# Altium footprint library ref-packages.PCBLIB: 1544 footprints (part 31 of 103) (continued)
## LCC-156 [mil] (continued)
Top Overlay:
  text "1" at -25,868.11 h77.5
Mechanical 16:
  drawing of 317 lines, arcs and shapes, not listed
Mechanical 27:
  lines w7.87: -1078.86,-1078.86 1078.86,-1078.86 1078.86,1078.86 -1078.86,1078.86 -1078.86,-1078.86

## LQFP48 [mm]
pads (48):
  rect 0.2x1 smd: 1(-2.75,-4.25) 2(-2.25,-4.25) 3(-1.75,-4.25) 4(-1.25,-4.25) 5(-0.75,-4.25) 6(-0.25,-4.25) 7(0.25,-4.25) 8(0.75,-4.25) 9(1.25,-4.25) 10(1.75,-4.25) 11(2.25,-4.25) 12(2.75,-4.25) 25(2.75,4.25) 26(2.25,4.25) 27(1.75,4.25) 28(1.25,4.25) 29(0.75,4.25) 30(0.25,4.25) 31(-0.25,4.25) 32(-0.75,4.25) 33(-1.25,4.25) 34(-1.75,4.25) 35(-2.25,4.25) 36(-2.75,4.25)
  rect 1x0.2 smd: 13(4.25,-2.75) 14(4.25,-2.25) 15(4.25,-1.75) 16(4.25,-1.25) 17(4.25,-0.75) 18(4.25,-0.25) 19(4.25,0.25) 20(4.25,0.75) 21(4.25,1.25) 22(4.25,1.75) 23(4.25,2.25) 24(4.25,2.75) 37(-4.25,2.75) 38(-4.25,2.25) 39(-4.25,1.75) 40(-4.25,1.25) 41(-4.25,0.75) 42(-4.25,0.25) 43(-4.25,-0.25) 44(-4.25,-0.75) 45(-4.25,-1.25) 46(-4.25,-1.75) 47(-4.25,-2.25) 48(-4.25,-2.75)
Top Overlay:
  circle w0.254: c-2,-2 r0.6
  lines w0.254: -3.375,-3.1 -3.1,-3.375 3.1,-3.375 3.375,-3.1 3.375,3.1 3.1,3.375 -3.1,3.375 -3.375,3.1 -3.375,-3.1
Mechanical 16:
  rectangle: -2.85,-4.5 -2.65,-3.45
  rectangle: -2.35,-4.5 -2.15,-3.45
  rectangle: -1.85,-4.5 -1.65,-3.45
  rectangle: -1.35,-4.5 -1.15,-3.45
  rectangle: -0.85,-4.5 -0.65,-3.45
  rectangle: -0.35,-4.5 -0.15,-3.45
  rectangle: 0.15,-4.5 0.35,-3.45
  rectangle: 0.65,-4.5 0.85,-3.45
  rectangle: 1.15,-4.5 1.35,-3.45
  rectangle: 1.65,-4.5 1.85,-3.45
  rectangle: 2.15,-4.5 2.35,-3.45
  rectangle: 2.65,-4.5 2.85,-3.45
  rectangle: 3.45,-2.85 4.5,-2.65
  rectangle: 3.45,-2.35 4.5,-2.15
  rectangle: 3.45,-1.85 4.5,-1.65
  rectangle: 3.45,-1.35 4.5,-1.15
  rectangle: 3.45,-0.85 4.5,-0.65
  rectangle: 3.45,-0.35 4.5,-0.15
  rectangle: 3.45,0.15 4.5,0.35
  rectangle: 3.45,0.65 4.5,0.85
  rectangle: 3.45,1.15 4.5,1.35
  rectangle: 3.45,1.65 4.5,1.85
  rectangle: 3.45,2.15 4.5,2.35
  rectangle: 3.45,2.65 4.5,2.85
  rectangle: 2.65,3.45 2.85,4.5
  rectangle: 2.15,3.45 2.35,4.5
  rectangle: 1.65,3.45 1.85,4.5
  rectangle: 1.15,3.45 1.35,4.5
  rectangle: 0.65,3.45 0.85,4.5
  rectangle: 0.15,3.45 0.35,4.5
  rectangle: -0.35,3.45 -0.15,4.5
  rectangle: -0.85,3.45 -0.65,4.5
  rectangle: -1.35,3.45 -1.15,4.5
  rectangle: -1.85,3.45 -1.65,4.5
  rectangle: -2.35,3.45 -2.15,4.5
  rectangle: -2.85,3.45 -2.65,4.5
  rectangle: -4.5,2.65 -3.45,2.85
  rectangle: -4.5,2.15 -3.45,2.35
  rectangle: -4.5,1.65 -3.45,1.85
  rectangle: -4.5,1.15 -3.45,1.35
  rectangle: -4.5,0.65 -3.45,0.85
  rectangle: -4.5,0.15 -3.45,0.35
  rectangle: -4.5,-0.35 -3.45,-0.15
  rectangle: -4.5,-0.85 -3.45,-0.65
  rectangle: -4.5,-1.35 -3.45,-1.15
  rectangle: -4.5,-1.85 -3.45,-1.65
  rectangle: -4.5,-2.35 -3.45,-2.15
  rectangle: -4.5,-2.85 -3.45,-2.65

## LQFP80 [mm]
pads (80):
  rect 0.4x1.2 smd: 1(-6.175,-7.7) 2(-5.525,-7.7) 3(-4.875,-7.7) 4(-4.225,-7.7) 5(-3.575,-7.7) 6(-2.925,-7.7) 7(-2.275,-7.7) 8(-1.625,-7.7) 9(-0.975,-7.7) 10(-0.325,-7.7) 11(0.325,-7.7) 12(0.975,-7.7) 13(1.625,-7.7) 14(2.275,-7.7) 15(2.925,-7.7) 16(3.575,-7.7) 17(4.225,-7.7) 18(4.875,-7.7) 19(5.525,-7.7) 20(6.175,-7.7) 41(6.175,7.7) 42(5.525,7.7) 43(4.875,7.7) 44(4.225,7.7) 45(3.575,7.7) 46(2.925,7.7) 47(2.275,7.7) 48(1.625,7.7) 49(0.975,7.7) 50(0.325,7.7) 51(-0.325,7.7) 52(-0.975,7.7) 53(-1.625,7.7) 54(-2.275,7.7) 55(-2.925,7.7) 56(-3.575,7.7) 57(-4.225,7.7) 58(-4.875,7.7) 59(-5.525,7.7) 60(-6.175,7.7)
  rect 1.2x0.4 smd: 21(7.7,-6.175) 22(7.7,-5.525) 23(7.7,-4.875) 24(7.7,-4.225) 25(7.7,-3.575) 26(7.7,-2.925) 27(7.7,-2.275) 28(7.7,-1.625) 29(7.7,-0.975) 30(7.7,-0.325) 31(7.7,0.325) 32(7.7,0.975) 33(7.7,1.625) 34(7.7,2.275) 35(7.7,2.925) 36(7.7,3.575) 37(7.7,4.225) 38(7.7,4.875) 39(7.7,5.525) 40(7.7,6.175) 61(-7.7,6.175) 62(-7.7,5.525) 63(-7.7,4.875) 64(-7.7,4.225) 65(-7.7,3.575) 66(-7.7,2.925) 67(-7.7,2.275) 68(-7.7,1.625) 69(-7.7,0.975) 70(-7.7,0.325) 71(-7.7,-0.325) 72(-7.7,-0.975) 73(-7.7,-1.625) 74(-7.7,-2.275) 75(-7.7,-2.925) 76(-7.7,-3.575) 77(-7.7,-4.225) 78(-7.7,-4.875) 79(-7.7,-5.525) 80(-7.7,-6.175)
Top Overlay:
  circle w0.254: c-5.5,-5.5 r0.75
  lines w0.203: -6.72,-6.71 6.71,-6.71 6.71,6.71 -6.72,6.71 -6.72,-6.71
Mechanical 14:
  lines w0.254: -5,-2.5 -5,2.5 -2.5,5 2.5,5 5,2.5 5,-2.5 2.5,-5 -2.5,-5 -5,-2.5
  text "THERMAL" at -2.5,3.675 h1.26
  text "SLUG" at -2.5,2.175 h1.26
  text "LQFP_ED" at -2.5,0.675 h1.26
Mechanical 16:
  rectangle: -6.375,-8 -5.975,-6.95
  rectangle: -5.725,-8 -5.325,-6.95
  rectangle: -5.075,-8 -4.675,-6.95
  rectangle: -4.425,-8 -4.025,-6.95
  rectangle: -3.775,-8 -3.375,-6.95
  rectangle: -3.125,-8 -2.725,-6.95
  rectangle: -2.475,-8 -2.075,-6.95
  rectangle: -1.825,-8 -1.425,-6.95
  rectangle: -1.175,-8 -0.775,-6.95
  rectangle: -0.525,-8 -0.125,-6.95
  rectangle: 0.125,-8 0.525,-6.95
  rectangle: 0.775,-8 1.175,-6.95
  rectangle: 1.425,-8 1.825,-6.95
  rectangle: 2.075,-8 2.475,-6.95
  rectangle: 2.725,-8 3.125,-6.95
  rectangle: 3.375,-8 3.775,-6.95
  rectangle: 4.025,-8 4.425,-6.95
  rectangle: 4.675,-8 5.075,-6.95
  rectangle: 5.325,-8 5.725,-6.95
  rectangle: 5.975,-8 6.375,-6.95
  rectangle: 6.95,-6.375 8,-5.975
  rectangle: 6.95,-5.725 8,-5.325
  rectangle: 6.95,-5.075 8,-4.675
  rectangle: 6.95,-4.425 8,-4.025
  rectangle: 6.95,-3.775 8,-3.375
  rectangle: 6.95,-3.125 8,-2.725
  rectangle: 6.95,-2.475 8,-2.075
  rectangle: 6.95,-1.825 8,-1.425
  rectangle: 6.95,-1.175 8,-0.775
  rectangle: 6.95,-0.525 8,-0.125
  rectangle: 6.95,0.125 8,0.525
  rectangle: 6.95,0.775 8,1.175
  rectangle: 6.95,1.425 8,1.825
  rectangle: 6.95,2.075 8,2.475
  rectangle: 6.95,2.725 8,3.125
  rectangle: 6.95,3.375 8,3.775
  rectangle: 6.95,4.025 8,4.425
  rectangle: 6.95,4.675 8,5.075
  rectangle: 6.95,5.325 8,5.725
  rectangle: 6.95,5.975 8,6.375
  rectangle: 5.975,6.95 6.375,8
  rectangle: 5.325,6.95 5.725,8
  rectangle: 4.675,6.95 5.075,8
  rectangle: 4.025,6.95 4.425,8
  rectangle: 3.375,6.95 3.775,8
  rectangle: 2.725,6.95 3.125,8
  rectangle: 2.075,6.95 2.475,8
  rectangle: 1.425,6.95 1.825,8
  rectangle: 0.775,6.95 1.175,8
  rectangle: 0.125,6.95 0.525,8
  rectangle: -0.525,6.95 -0.125,8
  rectangle: -1.175,6.95 -0.775,8
  rectangle: -1.825,6.95 -1.425,8
  rectangle: -2.475,6.95 -2.075,8
  rectangle: -3.125,6.95 -2.725,8
  rectangle: -3.775,6.95 -3.375,8
  rectangle: -4.425,6.95 -4.025,8
  rectangle: -5.075,6.95 -4.675,8
  rectangle: -5.725,6.95 -5.325,8
  rectangle: -6.375,6.95 -5.975,8
  rectangle: -8,5.975 -6.95,6.375
  rectangle: -8,5.325 -6.95,5.725
  rectangle: -8,4.675 -6.95,5.075
  rectangle: -8,4.025 -6.95,4.425
  rectangle: -8,3.375 -6.95,3.775
  rectangle: -8,2.725 -6.95,3.125
  rectangle: -8,2.075 -6.95,2.475
  rectangle: -8,1.425 -6.95,1.825
  rectangle: -8,0.775 -6.95,1.175
  rectangle: -8,0.125 -6.95,0.525
  rectangle: -8,-0.525 -6.95,-0.125
  rectangle: -8,-1.175 -6.95,-0.775
  rectangle: -8,-1.825 -6.95,-1.425
  rectangle: -8,-2.475 -6.95,-2.075
  rectangle: -8,-3.125 -6.95,-2.725
  rectangle: -8,-3.775 -6.95,-3.375
  rectangle: -8,-4.425 -6.95,-4.025
  rectangle: -8,-5.075 -6.95,-4.675
  rectangle: -8,-5.725 -6.95,-5.325
  rectangle: -8,-6.375 -6.95,-5.975
  lines w0.203: -6.91,-6.91 6.91,-6.91 6.91,6.91 -6.91,6.91 -6.91,-6.91

## LQFP100 [mm]
pads (100):
  rect 0.9x0.3 smd: 1(-7.72,6) 2(-7.72,5.5) 3(-7.72,5) 4(-7.72,4.5) 5(-7.72,4) 6(-7.72,3.5) 7(-7.72,3) 8(-7.72,2.5) 9(-7.72,2) 10(-7.72,1.5) 11(-7.72,1) 12(-7.72,0.5) 13(-7.72,0) 14(-7.72,-0.5) 15(-7.72,-1) 16(-7.72,-1.5) 17(-7.72,-2) 18(-7.72,-2.5) 19(-7.72,-3) 20(-7.72,-3.5) 21(-7.72,-4) 22(-7.72,-4.5) 23(-7.72,-5) 24(-7.72,-5.5) 25(-7.72,-6) 51(7.72,-6) 52(7.72,-5.5) 53(7.72,-5) 54(7.72,-4.5) 55(7.72,-4) 56(7.72,-3.5) 57(7.72,-3) 58(7.72,-2.5) 59(7.72,-2) 60(7.72,-1.5) 61(7.72,-1) 62(7.72,-0.5) 63(7.72,0) 64(7.72,0.5) 65(7.72,1) 66(7.72,1.5) 67(7.72,2) 68(7.72,2.5) 69(7.72,3) 70(7.72,3.5) 71(7.72,4) 72(7.72,4.5) 73(7.72,5) 74(7.72,5.5) 75(7.72,6)
  rect 0.3x0.9 smd: 26(-6,-7.72) 27(-5.5,-7.72) 28(-5,-7.72) 29(-4.5,-7.72) 30(-4,-7.72) 31(-3.5,-7.72) 32(-3,-7.72) 33(-2.5,-7.72) 34(-2,-7.72) 35(-1.5,-7.72) 36(-1,-7.72) 37(-0.5,-7.72) 38(0,-7.72) 39(0.5,-7.72) 40(1,-7.72) 41(1.5,-7.72) 42(2,-7.72) 43(2.5,-7.72) 44(3,-7.72) 45(3.5,-7.72) 46(4,-7.72) 47(4.5,-7.72) 48(5,-7.72) 49(5.5,-7.72) 50(6,-7.72) 76(6,7.72) 77(5.5,7.72) 78(5,7.72) 79(4.5,7.72) 80(4,7.72) 81(3.5,7.72) 82(3,7.72) 83(2.5,7.72) 84(2,7.72) 85(1.5,7.72) 86(1,7.72) 87(0.5,7.72) 88(0,7.72) 89(-0.5,7.72) 90(-1,7.72) 91(-1.5,7.72) 92(-2,7.72) 93(-2.5,7.72) 94(-3,7.72) 95(-3.5,7.72) 96(-4,7.72) 97(-4.5,7.72) 98(-5,7.72) 99(-5.5,7.72) 100(-6,7.72)
Top Overlay:
  circle w0.203: c-5.9,5.9 r0.5
  lines w0.203: -6.9,-6.4 -6.9,6.4 -6.4,6.9 6.4,6.9 6.9,6.4 6.9,-6.4 6.4,-6.9 -6.4,-6.9 -6.9,-6.4
Mechanical 16:
  rectangle: -8.03,5.89 -6.93,6.11
  rectangle: -8.03,5.39 -6.93,5.61
  rectangle: -8.03,4.89 -6.93,5.11
  rectangle: -8.03,4.39 -6.93,4.61
  rectangle: -8.03,3.89 -6.93,4.11
  rectangle: -8.03,3.39 -6.93,3.61
  rectangle: -8.03,2.89 -6.93,3.11
  rectangle: -8.03,2.39 -6.93,2.61
  rectangle: -8.03,1.89 -6.93,2.11
  rectangle: -8.03,1.39 -6.93,1.61
  rectangle: -8.03,0.89 -6.93,1.11
  rectangle: -8.03,0.39 -6.93,0.61
  rectangle: -8.03,-0.11 -6.93,0.11
  rectangle: -8.03,-0.61 -6.93,-0.39
  rectangle: -8.03,-1.11 -6.93,-0.89
  rectangle: -8.03,-1.61 -6.93,-1.39
  rectangle: -8.03,-2.11 -6.93,-1.89
  rectangle: -8.03,-2.61 -6.93,-2.39
  rectangle: -8.03,-3.11 -6.93,-2.89
  rectangle: -8.03,-3.61 -6.93,-3.39
  rectangle: -8.03,-4.11 -6.93,-3.89
  rectangle: -8.03,-4.61 -6.93,-4.39
  rectangle: -8.03,-5.11 -6.93,-4.89
  rectangle: -8.03,-5.61 -6.93,-5.39
  rectangle: -8.03,-6.11 -6.93,-5.89
  rectangle: -6.11,-8.03 -5.89,-6.93
  rectangle: -5.61,-8.03 -5.39,-6.93
  rectangle: -5.11,-8.03 -4.89,-6.93
  rectangle: -4.61,-8.03 -4.39,-6.93
  rectangle: -4.11,-8.03 -3.89,-6.93
  rectangle: -3.61,-8.03 -3.39,-6.93
  rectangle: -3.11,-8.03 -2.89,-6.93
  rectangle: -2.61,-8.03 -2.39,-6.93
  rectangle: -2.11,-8.03 -1.89,-6.93
  rectangle: -1.61,-8.03 -1.39,-6.93
  rectangle: -1.11,-8.03 -0.89,-6.93
  rectangle: -0.61,-8.03 -0.39,-6.93
  rectangle: -0.11,-8.03 0.11,-6.93
  rectangle: 0.39,-8.03 0.61,-6.93
  rectangle: 0.89,-8.03 1.11,-6.93
  rectangle: 1.39,-8.03 1.61,-6.93
  rectangle: 1.89,-8.03 2.11,-6.93
  rectangle: 2.39,-8.03 2.61,-6.93
  rectangle: 2.89,-8.03 3.11,-6.93
  rectangle: 3.39,-8.03 3.61,-6.93
  rectangle: 3.89,-8.03 4.11,-6.93
  rectangle: 4.39,-8.03 4.61,-6.93
  rectangle: 4.89,-8.03 5.11,-6.93
  rectangle: 5.39,-8.03 5.61,-6.93
  rectangle: 5.89,-8.03 6.11,-6.93
  rectangle: 6.93,-6.11 8.03,-5.89
  rectangle: 6.93,-5.61 8.03,-5.39
  rectangle: 6.93,-5.11 8.03,-4.89
  rectangle: 6.93,-4.61 8.03,-4.39
  rectangle: 6.93,-4.11 8.03,-3.89
  rectangle: 6.93,-3.61 8.03,-3.39
  rectangle: 6.93,-3.11 8.03,-2.89
  rectangle: 6.93,-2.61 8.03,-2.39
  rectangle: 6.93,-2.11 8.03,-1.89
  rectangle: 6.93,-1.61 8.03,-1.39
  rectangle: 6.93,-1.11 8.03,-0.89
  rectangle: 6.93,-0.61 8.03,-0.39
  rectangle: 6.93,-0.11 8.03,0.11
  rectangle: 6.93,0.39 8.03,0.61
  rectangle: 6.93,0.89 8.03,1.11
  rectangle: 6.93,1.39 8.03,1.61
  rectangle: 6.93,1.89 8.03,2.11
  rectangle: 6.93,2.39 8.03,2.61
  rectangle: 6.93,2.89 8.03,3.11
  rectangle: 6.93,3.39 8.03,3.61
  rectangle: 6.93,3.89 8.03,4.11
  rectangle: 6.93,4.39 8.03,4.61
  rectangle: 6.93,4.89 8.03,5.11
  rectangle: 6.93,5.39 8.03,5.61
  rectangle: 6.93,5.89 8.03,6.11
  rectangle: 5.89,6.93 6.11,8.03
  rectangle: 5.39,6.93 5.61,8.03
  rectangle: 4.89,6.93 5.11,8.03
  rectangle: 4.39,6.93 4.61,8.03
  rectangle: 3.89,6.93 4.11,8.03
  rectangle: 3.39,6.93 3.61,8.03
  rectangle: 2.89,6.93 3.11,8.03
  rectangle: 2.39,6.93 2.61,8.03
  rectangle: 1.89,6.93 2.11,8.03
  rectangle: 1.39,6.93 1.61,8.03
  rectangle: 0.89,6.93 1.11,8.03
  rectangle: 0.39,6.93 0.61,8.03
  rectangle: -0.11,6.93 0.11,8.03
  rectangle: -0.61,6.93 -0.39,8.03
  rectangle: -1.11,6.93 -0.89,8.03
  rectangle: -1.61,6.93 -1.39,8.03
  rectangle: -2.11,6.93 -1.89,8.03
  rectangle: -2.61,6.93 -2.39,8.03
  rectangle: -3.11,6.93 -2.89,8.03
  rectangle: -3.61,6.93 -3.39,8.03
  rectangle: -4.11,6.93 -3.89,8.03
  rectangle: -4.61,6.93 -4.39,8.03
  rectangle: -5.11,6.93 -4.89,8.03
  rectangle: -5.61,6.93 -5.39,8.03
  rectangle: -6.11,6.93 -5.89,8.03

## LQFP120 [mm]
pads (120):
  rect 0.25x1 smd: 1(-7.25,-8.75) 2(-6.75,-8.75) 3(-6.25,-8.75) 4(-5.75,-8.75) 5(-5.25,-8.75) 6(-4.75,-8.75) 7(-4.25,-8.75) 8(-3.75,-8.75) 9(-3.25,-8.75) 10(-2.75,-8.75) 11(-2.25,-8.75) 12(-1.75,-8.75) 13(-1.25,-8.75) 14(-0.75,-8.75) 15(-0.25,-8.75) 16(0.25,-8.75) 17(0.75,-8.75) 18(1.25,-8.75) 19(1.75,-8.75) 20(2.25,-8.75) 21(2.75,-8.75) 22(3.25,-8.75) 23(3.75,-8.75) 24(4.25,-8.75) 25(4.75,-8.75) 26(5.25,-8.75) 27(5.75,-8.75) 28(6.25,-8.75) 29(6.75,-8.75) 30(7.25,-8.75) 61(7.25,8.75) 62(6.75,8.75) 63(6.25,8.75) 64(5.75,8.75) 65(5.25,8.75) 66(4.75,8.75) 67(4.25,8.75) 68(3.75,8.75) 69(3.25,8.75) 70(2.75,8.75) 71(2.25,8.75) 72(1.75,8.75) 73(1.25,8.75) 74(0.75,8.75) 75(0.25,8.75) 76(-0.25,8.75) 77(-0.75,8.75) 78(-1.25,8.75) 79(-1.75,8.75) 80(-2.25,8.75) 81(-2.75,8.75) 82(-3.25,8.75) 83(-3.75,8.75) 84(-4.25,8.75) 85(-4.75,8.75) 86(-5.25,8.75) 87(-5.75,8.75) 88(-6.25,8.75) 89(-6.75,8.75) 90(-7.25,8.75)
  rect 1x0.25 smd: 31(8.75,-7.25) 32(8.75,-6.75) 33(8.75,-6.25) 34(8.75,-5.75) 35(8.75,-5.25) 36(8.75,-4.75) 37(8.75,-4.25) 38(8.75,-3.75) 39(8.75,-3.25) 40(8.75,-2.75) 41(8.75,-2.25) 42(8.75,-1.75) 43(8.75,-1.25) 44(8.75,-0.75) 45(8.75,-0.25) 46(8.75,0.25) 47(8.75,0.75) 48(8.75,1.25) 49(8.75,1.75) 50(8.75,2.25) 51(8.75,2.75) 52(8.75,3.25) 53(8.75,3.75) 54(8.75,4.25) 55(8.75,4.75) 56(8.75,5.25) 57(8.75,5.75) 58(8.75,6.25) 59(8.75,6.75) 60(8.75,7.25) 91(-8.75,7.25) 92(-8.75,6.75) 93(-8.75,6.25) 94(-8.75,5.75) 95(-8.75,5.25) 96(-8.75,4.75) 97(-8.75,4.25) 98(-8.75,3.75) 99(-8.75,3.25) 100(-8.75,2.75) 101(-8.75,2.25) 102(-8.75,1.75) 103(-8.75,1.25) 104(-8.75,0.75) 105(-8.75,0.25) 106(-8.75,-0.25) 107(-8.75,-0.75) 108(-8.75,-1.25) 109(-8.75,-1.75) 110(-8.75,-2.25) 111(-8.75,-2.75) 112(-8.75,-3.25) 113(-8.75,-3.75) 114(-8.75,-4.25) 115(-8.75,-4.75) 116(-8.75,-5.25) 117(-8.75,-5.75) 118(-8.75,-6.25) 119(-8.75,-6.75) 120(-8.75,-7.25)
Top Overlay:
  circle w0.254: c-6.75,-6.75 r0.5
Mechanical 16:
  rectangle: -7.35,-9 -7.15,-8
  rectangle: -6.85,-9 -6.65,-8
  rectangle: -6.35,-9 -6.15,-8
  rectangle: -5.85,-9 -5.65,-8
  rectangle: -5.35,-9 -5.15,-8
  rectangle: -4.85,-9 -4.65,-8
  rectangle: -4.35,-9 -4.15,-8
  rectangle: -3.85,-9 -3.65,-8
  rectangle: -3.35,-9 -3.15,-8
  rectangle: -2.85,-9 -2.65,-8
  rectangle: -2.35,-9 -2.15,-8
  rectangle: -1.85,-9 -1.65,-8
  rectangle: -1.35,-9 -1.15,-8
  rectangle: -0.85,-9 -0.65,-8
  rectangle: -0.35,-9 -0.15,-8
  rectangle: 0.15,-9 0.35,-8
  rectangle: 0.65,-9 0.85,-8
  rectangle: 1.15,-9 1.35,-8
  rectangle: 1.65,-9 1.85,-8
  rectangle: 2.15,-9 2.35,-8
  rectangle: 2.65,-9 2.85,-8
  rectangle: 3.15,-9 3.35,-8
  rectangle: 3.65,-9 3.85,-8
  rectangle: 4.15,-9 4.35,-8
  rectangle: 4.65,-9 4.85,-8
  rectangle: 5.15,-9 5.35,-8
  rectangle: 5.65,-9 5.85,-8
  rectangle: 6.15,-9 6.35,-8
  rectangle: 6.65,-9 6.85,-8
  rectangle: 7.15,-9 7.35,-8
  rectangle: 8,-7.35 9,-7.15
  rectangle: 8,-6.85 9,-6.65
  rectangle: 8,-6.35 9,-6.15
  rectangle: 8,-5.85 9,-5.65
  rectangle: 8,-5.35 9,-5.15
  rectangle: 8,-4.85 9,-4.65
  rectangle: 8,-4.35 9,-4.15
  rectangle: 8,-3.85 9,-3.65
  rectangle: 8,-3.35 9,-3.15
  rectangle: 8,-2.85 9,-2.65
  rectangle: 8,-2.35 9,-2.15
  rectangle: 8,-1.85 9,-1.65
  rectangle: 8,-1.35 9,-1.15
  rectangle: 8,-0.85 9,-0.65
  rectangle: 8,-0.35 9,-0.15
  rectangle: 8,0.15 9,0.35
  rectangle: 8,0.65 9,0.85
  rectangle: 8,1.15 9,1.35
  rectangle: 8,1.65 9,1.85
  rectangle: 8,2.15 9,2.35
  rectangle: 8,2.65 9,2.85
  rectangle: 8,3.15 9,3.35
  rectangle: 8,3.65 9,3.85
  rectangle: 8,4.15 9,4.35
  rectangle: 8,4.65 9,4.85
  rectangle: 8,5.15 9,5.35
  rectangle: 8,5.65 9,5.85
  rectangle: 8,6.15 9,6.35
  rectangle: 8,6.65 9,6.85
  rectangle: 8,7.15 9,7.35
  rectangle: 7.15,8 7.35,9
  rectangle: 6.65,8 6.85,9
  rectangle: 6.15,8 6.35,9
  rectangle: 5.65,8 5.85,9
  rectangle: 5.15,8 5.35,9
  rectangle: 4.65,8 4.85,9
  rectangle: 4.15,8 4.35,9
  rectangle: 3.65,8 3.85,9
  rectangle: 3.15,8 3.35,9
  rectangle: 2.65,8 2.85,9
  rectangle: 2.15,8 2.35,9
  rectangle: 1.65,8 1.85,9
  rectangle: 1.15,8 1.35,9
  rectangle: 0.65,8 0.85,9
  rectangle: 0.15,8 0.35,9
  rectangle: -0.35,8 -0.15,9
  rectangle: -0.85,8 -0.65,9
  rectangle: -1.35,8 -1.15,9
  rectangle: -1.85,8 -1.65,9
  rectangle: -2.35,8 -2.15,9
  rectangle: -2.85,8 -2.65,9
  rectangle: -3.35,8 -3.15,9
  rectangle: -3.85,8 -3.65,9
  rectangle: -4.35,8 -4.15,9
  rectangle: -4.85,8 -4.65,9
  rectangle: -5.35,8 -5.15,9
  rectangle: -5.85,8 -5.65,9
  rectangle: -6.35,8 -6.15,9
  rectangle: -6.85,8 -6.65,9
  rectangle: -7.35,8 -7.15,9
  rectangle: -9,7.15 -8,7.35
  rectangle: -9,6.65 -8,6.85
  rectangle: -9,6.15 -8,6.35
  rectangle: -9,5.65 -8,5.85
  rectangle: -9,5.15 -8,5.35
  rectangle: -9,4.65 -8,4.85
  rectangle: -9,4.15 -8,4.35
  rectangle: -9,3.65 -8,3.85
  rectangle: -9,3.15 -8,3.35
  rectangle: -9,2.65 -8,2.85
  rectangle: -9,2.15 -8,2.35
  rectangle: -9,1.65 -8,1.85
  rectangle: -9,1.15 -8,1.35
  rectangle: -9,0.65 -8,0.85
  rectangle: -9,0.15 -8,0.35
  rectangle: -9,-0.35 -8,-0.15
  rectangle: -9,-0.85 -8,-0.65
  rectangle: -9,-1.35 -8,-1.15
  rectangle: -9,-1.85 -8,-1.65
  rectangle: -9,-2.35 -8,-2.15
  rectangle: -9,-2.85 -8,-2.65
  rectangle: -9,-3.35 -8,-3.15
  rectangle: -9,-3.85 -8,-3.65
  rectangle: -9,-4.35 -8,-4.15
  rectangle: -9,-4.85 -8,-4.65
  rectangle: -9,-5.35 -8,-5.15
  rectangle: -9,-5.85 -8,-5.65
  rectangle: -9,-6.35 -8,-6.15
  rectangle: -9,-6.85 -8,-6.65
  rectangle: -9,-7.35 -8,-7.15
  lines w0.254: -7.875,-7.55 -7.55,-7.875 7.55,-7.875 7.875,-7.55 7.875,7.55 7.55,7.875 -7.55,7.875 -7.875,7.55 -7.875,-7.55

## LQFP160 [mm]
pads (160):
  rect 1x0.27 smd: 1(-12.7,9.75) 2(-12.7,9.25) 3(-12.7,8.75) 4(-12.7,8.25) 5(-12.7,7.75) 6(-12.7,7.25) 7(-12.7,6.75) 8(-12.7,6.25) 9(-12.7,5.75) 10(-12.7,5.25) 11(-12.7,4.75) 12(-12.7,4.25) 13(-12.7,3.75) 14(-12.7,3.25) 15(-12.7,2.75) 16(-12.7,2.25) 17(-12.7,1.75) 18(-12.7,1.25) 19(-12.7,0.75) 20(-12.7,0.25) 21(-12.7,-0.25) 22(-12.7,-0.75) 23(-12.7,-1.25) 24(-12.7,-1.75) 25(-12.7,-2.25) 26(-12.7,-2.75) 27(-12.7,-3.25) 28(-12.7,-3.75) 29(-12.7,-4.25) 30(-12.7,-4.75) 31(-12.7,-5.25) 32(-12.7,-5.75) 33(-12.7,-6.25) 34(-12.7,-6.75) 35(-12.7,-7.25) 36(-12.7,-7.75) 37(-12.7,-8.25) 38(-12.7,-8.75) 39(-12.7,-9.25) 40(-12.7,-9.75) 81(12.7,-9.75) 82(12.7,-9.25) 83(12.7,-8.75) 84(12.7,-8.25) 85(12.7,-7.75) 86(12.7,-7.25) 87(12.7,-6.75) 88(12.7,-6.25) 89(12.7,-5.75) 90(12.7,-5.25) 91(12.7,-4.75) 92(12.7,-4.25) 93(12.7,-3.75) 94(12.7,-3.25) 95(12.7,-2.75) 96(12.7,-2.25) 97(12.7,-1.75) 98(12.7,-1.25) 99(12.7,-0.75) 100(12.7,-0.25) 101(12.7,0.25) 102(12.7,0.75) 103(12.7,1.25) 104(12.7,1.75) 105(12.7,2.25) 106(12.7,2.75) 107(12.7,3.25) 108(12.7,3.75) 109(12.7,4.25) 110(12.7,4.75) 111(12.7,5.25) 112(12.7,5.75) 113(12.7,6.25) 114(12.7,6.75) 115(12.7,7.25) 116(12.7,7.75) 117(12.7,8.25) 118(12.7,8.75) 119(12.7,9.25) 120(12.7,9.75)
  rect 0.27x1 smd: 41(-9.75,-12.7) 42(-9.25,-12.7) 43(-8.75,-12.7) 44(-8.25,-12.7) 45(-7.75,-12.7) 46(-7.25,-12.7) 47(-6.75,-12.7) 48(-6.25,-12.7) 49(-5.75,-12.7) 50(-5.25,-12.7) 51(-4.75,-12.7) 52(-4.25,-12.7) 53(-3.75,-12.7) 54(-3.25,-12.7) 55(-2.75,-12.7) 56(-2.25,-12.7) 57(-1.75,-12.7) 58(-1.25,-12.7) 59(-0.75,-12.7) 60(-0.25,-12.7) 61(0.25,-12.7) 62(0.75,-12.7) 63(1.25,-12.7) 64(1.75,-12.7) 65(2.25,-12.7) 66(2.75,-12.7) 67(3.25,-12.7) 68(3.75,-12.7) 69(4.25,-12.7) 70(4.75,-12.7) 71(5.25,-12.7) 72(5.75,-12.7) 73(6.25,-12.7) 74(6.75,-12.7) 75(7.25,-12.7) 76(7.75,-12.7) 77(8.25,-12.7) 78(8.75,-12.7) 79(9.25,-12.7) 80(9.75,-12.7) 121(9.75,12.7) 122(9.25,12.7) 123(8.75,12.7) 124(8.25,12.7) 125(7.75,12.7) 126(7.25,12.7) 127(6.75,12.7) 128(6.25,12.7) 129(5.75,12.7) 130(5.25,12.7) 131(4.75,12.7) 132(4.25,12.7) 133(3.75,12.7) 134(3.25,12.7) 135(2.75,12.7) 136(2.25,12.7) 137(1.75,12.7) 138(1.25,12.7) 139(0.75,12.7) 140(0.25,12.7) 141(-0.25,12.7) 142(-0.75,12.7) 143(-1.25,12.7) 144(-1.75,12.7) 145(-2.25,12.7) 146(-2.75,12.7) 147(-3.25,12.7) 148(-3.75,12.7) 149(-4.25,12.7) 150(-4.75,12.7) 151(-5.25,12.7) 152(-5.75,12.7) 153(-6.25,12.7) 154(-6.75,12.7) 155(-7.25,12.7) 156(-7.75,12.7) 157(-8.25,12.7) 158(-8.75,12.7) 159(-9.25,12.7) 160(-9.75,12.7)
Top Overlay:
  circle w0.203: c-10.5,10.5 r0.5
  lines w0.203: -11.9,-10.9 -11.9,10.9 -10.9,11.9 10.9,11.9 11.9,10.9 11.9,-10.9 10.9,-11.9 -10.9,-11.9 -11.9,-10.9
Mechanical 16:
  drawing of 165 lines, arcs and shapes, not listed

## LQFP-32 [mil]
pads (32):
  rect 11.81x62.99 smd: 1(-68.9,-122.05) 2(-49.21,-122.05) 3(-29.53,-122.05) 4(-9.84,-122.05) 5(9.84,-122.05) 6(29.53,-122.05) 7(49.21,-122.05) 8(68.9,-122.05) 17(68.9,122.05) 18(49.21,122.05) 19(29.53,122.05) 20(9.84,122.05) 21(-9.84,122.05) 22(-29.53,122.05) 23(-49.21,122.05) 24(-68.9,122.05)
  rect 62.99x11.81 smd: 9(122.05,-68.9) 10(122.05,-49.21) 11(122.05,-29.53) 12(122.05,-9.84) 13(122.05,9.84) 14(122.05,29.53) 15(122.05,49.21) 16(122.05,68.9) 25(-122.05,68.9) 26(-122.05,49.21) 27(-122.05,29.53) 28(-122.05,9.84) 29(-122.05,-9.84) 30(-122.05,-29.53) 31(-122.05,-49.21) 32(-122.05,-68.9)
Top Overlay:
  circle w10: c-49.21,-49.21 r19.69
  lines w8: -86.61,-71.39 -86.61,86.61 86.61,86.61 86.61,-86.61 -71.61,-86.61 -86.61,-71.39
Mechanical 6:
  rectangle: -39.37,-39.37 39.37,39.37
Mechanical 16:
  rectangle: -74.8,-141.73 -62.99,-96.46
  rectangle: -55.12,-141.73 -43.31,-96.46
  rectangle: -35.43,-141.73 -23.62,-96.46
  rectangle: -15.75,-141.73 -3.94,-96.46
  rectangle: 3.94,-141.73 15.75,-96.46
  rectangle: 23.62,-141.73 35.43,-96.46
  rectangle: 43.31,-141.73 55.12,-96.46
  rectangle: 62.99,-141.73 74.8,-96.46
  rectangle: 96.46,-74.8 141.73,-62.99
  rectangle: 96.46,-55.12 141.73,-43.31
  rectangle: 96.46,-35.43 141.73,-23.62
  rectangle: 96.46,-15.75 141.73,-3.94
  rectangle: 96.46,3.94 141.73,15.75
  rectangle: 96.46,23.62 141.73,35.43
  rectangle: 96.46,43.31 141.73,55.12
  rectangle: 96.46,62.99 141.73,74.8
  rectangle: 62.99,96.46 74.8,141.73
  rectangle: 43.31,96.46 55.12,141.73
  rectangle: 23.62,96.46 35.43,141.73
  rectangle: 3.94,96.46 15.75,141.73
  rectangle: -15.75,96.46 -3.94,141.73
  rectangle: -35.43,96.46 -23.62,141.73
  rectangle: -55.12,96.46 -43.31,141.73
  rectangle: -74.8,96.46 -62.99,141.73
  rectangle: -141.73,62.99 -96.46,74.8
  rectangle: -141.73,43.31 -96.46,55.12
  rectangle: -141.73,23.62 -96.46,35.43
  rectangle: -141.73,3.94 -96.46,15.75
  rectangle: -141.73,-15.75 -96.46,-3.94
  rectangle: -141.73,-35.43 -96.46,-23.62
  rectangle: -141.73,-55.12 -96.46,-43.31
  rectangle: -141.73,-74.8 -96.46,-62.99
  lines w8: -94.49,-94.49 94.49,-94.49 94.49,94.49 -94.49,94.49 -94.49,-94.49
Mechanical 27:
  lines w7.87: -173.23,-173.23 -173.23,173.23 173.23,173.23 173.23,-173.23 -173.23,-173.23

## M0805 [mil]
pads (2):
  rect 51.18x62.99 smd: 1(-37.4,0) 2(37.4,0)
Mechanical 6:
  rectangle: -7.87,-23.62 7.87,23.62
Mechanical 16:
  rectangle: -41,-28 -27,28
  rectangle: 27,-28 41,28
  lines w6: -28,-25 28,-25 ; -28,25 28,25
Mechanical 27:
  lines w2: -77.68,-38.7 77.68,-38.7 77.68,38.7 -77.68,38.7 -77.68,-38.7

## M1206 [mm]
pads (2):
  rect 1.6x2 smd: 1(-1.4,0) 2(1.4,0)
Mechanical 6:
  rectangle: -0.3,-0.8 0.3,0.8
Mechanical 16:
  rectangle: -1.702,-0.914 -1.118,0.914
  rectangle: 1.118,-0.914 1.702,0.914
  lines w0.152: -1.143,-0.838 1.143,-0.838 ; -1.143,0.838 1.143,0.838
Mechanical 27:
  lines w0.051: -2.473,-1.483 2.473,-1.483 2.473,1.483 -2.473,1.483 -2.473,-1.483

## M1406 [mil]
pads (2):
  rect 55.12x70.87 smd: 1(-66.93,0) 2(66.93,0)
Mechanical 6:
  rectangle: -11.81,-27.56 11.81,27.56
Mechanical 16:
  rectangle: -73,-33 -51,33
  rectangle: 51,-33 73,33
  lines w6: -52,-30 52,-30 ; -52,30 52,30
Mechanical 27:
  lines w2: -117.05,-38.7 117.05,-38.7 117.05,38.7 -117.05,38.7 -117.05,-38.7

## M2012 [mil]
pads (2):
  rect 51.18x62.99 smd: 1(-37.4,0) 2(37.4,0)
Mechanical 6:
  rectangle: -7.87,-23.62 7.87,23.62
Mechanical 16:
  rectangle: -41,-28 -27,28
  rectangle: 27,-28 41,28
  lines w6: -28,-25 28,-25 ; -28,25 28,25
Mechanical 27:
  lines w2: -77.68,-38.7 77.68,-38.7 77.68,38.7 -77.68,38.7 -77.68,-38.7